# Altium footprint library XU-GENARAL PCB .PcbLib: 1176 footprints (part 6 of 75)
Each footprint in its own frame and in the unit in brackets; x right, y up, seen from the top. Pads: shape width x height; smd on the part's side, far side on the other; paste and mask are expansions set on the pad; w line width, h text height; cw(c..) or ccw(c..) is an arc to the next point about the centre after c.
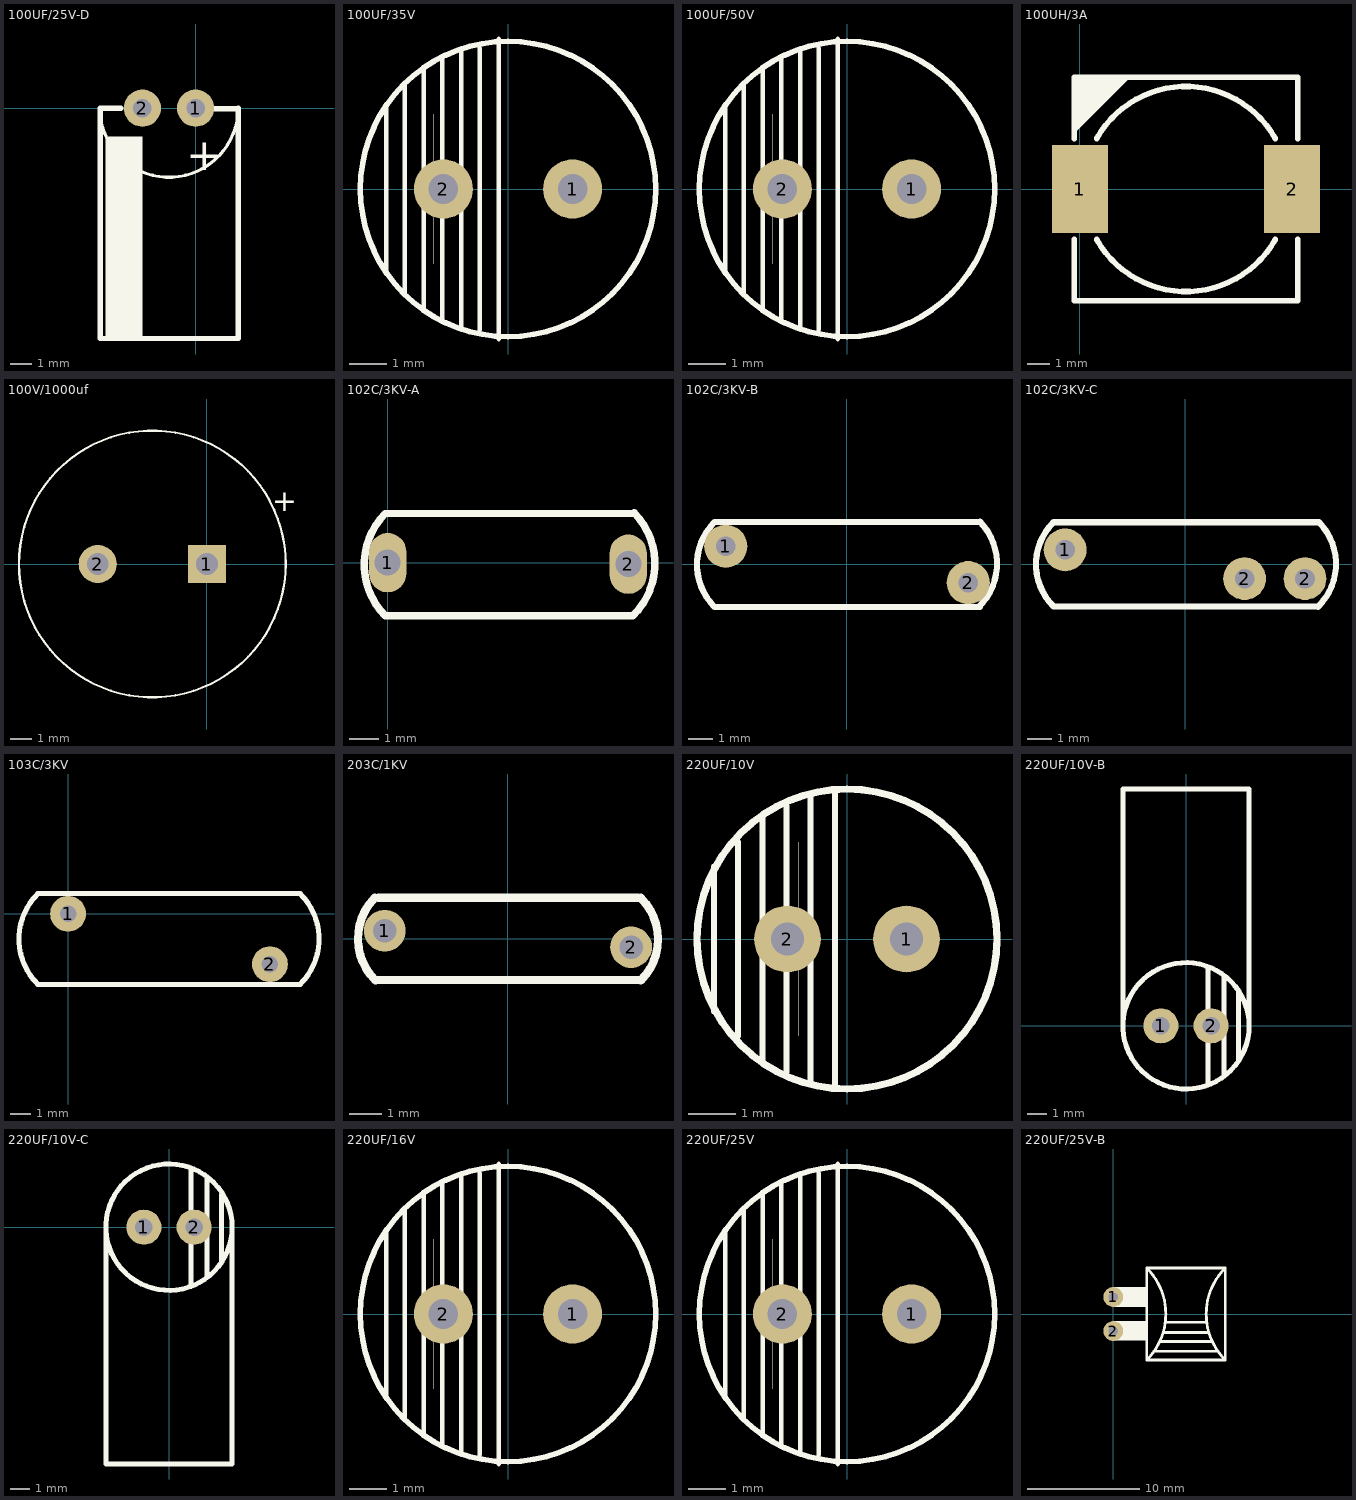
[diagram p5: the footprints below, top view; thin cyan lines are the x and y axes]

## 100UF/25V-D [mil]
pads (2):
  round 70 hole 35: 1(0,0) 2(-100,0)
Top Overlay:
  rectangle: -169,-434.07 -100,-53
  lines w6: -180,0 ccw(c-50,0) 80,0
  lines w10: -141,0 -179,0 -179,-433.07 80,-433.07 80,0 ; 36,-1 79,-1
  text "+" at -18,-117 h60

## 100UF/35V [mm]
pads (2):
  round 1.6 hole 0.8: 1(1.75,0) 2(-1.75,0)
Top Overlay:
  circle w0.152: c0,0 r4
  rectangle: -2.032,-2.032 -2.032,2.032
  lines w0.127: -3.302,-2.286 -3.302,2.286 ; -2.794,-2.794 -2.794,2.794 ; -2.286,-3.302 -2.286,3.302 ; -1.778,-3.556 -1.778,3.556 ; -1.27,-3.81 -1.27,3.81 ; -0.762,-3.81 -0.762,3.81 ; -0.254,-4.064 -0.254,4.064

## 100UF/50V [mm]
pads (2):
  round 1.6 hole 0.8: 1(1.75,0) 2(-1.75,0)
Top Overlay:
  circle w0.152: c0,0 r4
  rectangle: -2.032,-2.032 -2.032,2.032
  lines w0.127: -3.302,-2.286 -3.302,2.286 ; -2.794,-2.794 -2.794,2.794 ; -2.286,-3.302 -2.286,3.302 ; -1.778,-3.556 -1.778,3.556 ; -1.27,-3.81 -1.27,3.81 ; -0.762,-3.81 -0.762,3.81 ; -0.254,-4.064 -0.254,4.064

## 100UH/3A [mm]
pads (2):
  rect 2.54x4 smd: 1(0,0) 2(9.652,0)
Top Overlay:
  region: -0.254,2.54 2.286,5.08 -0.254,5.08
  lines w0.254: -0.254,-2.286 -0.254,-5.08 9.906,-5.08 9.906,-2.286 ; -0.254,2.286 -0.254,5.08 9.906,5.08 9.906,2.286 ; 0.756,-2.289 ccw(c4.826,0) 8.896,-2.289 ; 0.756,2.289 cw(c4.826,0) 8.896,2.289

## 100V/1000uf [mil]
pads (2):
  rect 70x70 hole 40: 1(0,0)
  round 70 hole 40: 2(-200,0)
Top Overlay:
  circle w4: c-100,0 r244.09
  text "+" at 165,130 h40

## 102C/3KV-A [mil]
pads (2):
  oval 50x80 hole 35: 1(0,0) 2(324,-2)
Top Overlay:
  lines w10: 329,-71.53 -3.15,-71.53 cw(c65.75,-2.63) -3.15,66.27 329,66.27 ; 330.22,-71.37 ccw(c261.93,-1.29) 332,67

## 102C/3KV-B [mil]
pads (2):
  round 70 hole 32: 1(-196.85,29.53) 2(196.85,-29.53)
Top Overlay:
  lines w10: 214,-69 ccw(c145.71,1.07) 215.78,69.37 ; 215.21,68.8 -215,68.8 ccw(c-146.1,-0.1) -215,-69 216,-69

## 102C/3KV-C [mil]
pads (3):
  round 70 hole 32: 1(-196.5,23.5) 2(97.5,-23.5) 2(196.5,-23.5)
Top Overlay:
  lines w10: 217.72,-69.6 ccw(c149.43,0.47) 219.5,68.77 116.5,68.77 -215.65,68.77 ccw(c-146.75,-0.13) -215.65,-69.03 116.5,-69.03 217.72,-69.03

## 103C/3KV [mil]
pads (2):
  round 70 hole 32: 1(0,0) 2(393.7,-98.43)
Top Overlay:
  lines w10: -59.06,-137.8 cw(c29.48,-49.26) -59.06,39.27 452.76,39.27 cw(c364.22,-49.26) 452.76,-137.8 -59.06,-137.8

## 203C/1KV [mm]
pads (2):
  round 1.27 hole 0.711: 1(-3.75,0.25) 2(3.75,-0.25)
Top Overlay:
  lines w0.254: -4.055,1.249 ccw(c-2.785,0.004) -4.029,-1.266 ; -3.95,-1.25 3.95,-1.25 ; -3.95,1.25 3.95,1.25 ; 4.048,-1.266 ccw(c2.79,-0.009) 4.048,1.249

## 220UF/10V [mm]
pads (2):
  round 1.4 hole 0.7: 1(1.25,0) 2(-1.25,0)
Top Overlay:
  circle w0.152: c0,0 r3.15
  rectangle: -1.016,-2.032 -1.016,2.032
  lines w0.127: -2.794,-1.524 -2.794,1.524 ; -2.286,-2.032 -2.286,2.032 ; -1.778,-2.54 -1.778,2.54 ; -1.27,-2.794 -1.27,2.794 ; -0.762,-3.048 -0.762,3.048 ; -0.254,-3.048 -0.254,3.048

## 220UF/10V-B [mil]
pads (2):
  round 70 hole 35: 1(-50,0) 2(50,0)
Top Overlay:
  circle w10: c0,0 r125.98
  lines w10: -126,0 -126,472.44 125.98,472.44 125.98,0 ; 44,-118 44,117 ; 76,-100 76,100 ; 105,-67 105,65

## 220UF/10V-C [mil]
pads (2):
  round 70 hole 35: 1(-50,0) 2(50,0)
Top Overlay:
  circle w10: c0,0 r125.98
  lines w10: -126,0 -126,-472.44 125.98,-472.44 125.98,0 ; 44,-118 44,117 ; 76,-100 76,100 ; 105,-67 105,65

## 220UF/16V [mm]
pads (2):
  round 1.6 hole 0.8: 1(1.75,0) 2(-1.75,0)
Top Overlay:
  circle w0.152: c0,0 r4
  rectangle: -2.032,-2.032 -2.032,2.032
  lines w0.127: -3.302,-2.286 -3.302,2.286 ; -2.794,-2.794 -2.794,2.794 ; -2.286,-3.302 -2.286,3.302 ; -1.778,-3.556 -1.778,3.556 ; -1.27,-3.81 -1.27,3.81 ; -0.762,-3.81 -0.762,3.81 ; -0.254,-4.064 -0.254,4.064

## 220UF/25V [mm]
pads (2):
  round 1.6 hole 0.8: 1(1.75,0) 2(-1.75,0)
Top Overlay:
  circle w0.152: c0,0 r4
  rectangle: -2.032,-2.032 -2.032,2.032
  lines w0.127: -3.302,-2.286 -3.302,2.286 ; -2.794,-2.794 -2.794,2.794 ; -2.286,-3.302 -2.286,3.302 ; -1.778,-3.556 -1.778,3.556 ; -1.27,-3.81 -1.27,3.81 ; -0.762,-3.81 -0.762,3.81 ; -0.254,-4.064 -0.254,4.064

## 220UF/25V-B [mil]
pads (2):
  round 70 hole 32: 1(0,60) 2(0,-60)
Top Overlay:
  rectangle: 0,25 121,95
  rectangle: 0,-94 120,-25
  lines w10: 145,-131 367,-131 ; 165,-97 349,-97 ; 177,-65 336,-65 ; 185,-29 329,-29 ; 118.11,-161.42 ccw(c-43.31,0) 118.11,161.42 ; 118.11,-161.42 118.11,161.42 ; 118.11,-161.42 393.7,-161.42 ; 118.11,161.42 393.7,161.42 ; 393.7,-161.42 cw(c555.12,0) 393.7,161.42 ; 393.7,-161.42 393.7,161.42